# Altium footprint library PCB_CONNECTORS.PcbLib: 676 footprints (part 1 of 43) (continued)
## AMPHENOL_L77SDEH09SOL2RM5 - duplicate [mm] "Straight D-SUB 9 Female Contacts for PCB with Rear Insert (UNC4-40) and RM5 Standoff Boardlock" (continued)
  text "1" at 8.85,1 h1.2
  text "5" at -9.525,1 h1.2
  text "6" at 8.525,-2.05 h1.2
  text "9" at -9.5,-2.025 h1.2
3D body "AMPHENOL_L77SDEH09SOL2RM5.stp": height 13, standoff -4.2, extent -15.445,-6.21 15.445,6.21

## AMPHENOL_L717DFA15P1ATN [mm] "Right Angled D-Sub 15 Male Contacts with Metal Bracket and Front Female Screwlock (UNC4-40)"
height 13.4
pads (17):
  round 1.6 hole 0.9: 1(9.59,-1.27) 2(6.85,-1.27) 3(4.11,-1.27) 4(1.37,-1.27) 5(-1.37,-1.27) 6(-4.11,-1.27) 7(-6.85,-1.27) 8(-9.59,-1.27) 9(8.22,1.27) 10(5.48,1.27) 11(2.74,1.27) 12(0,1.27) 13(-2.74,1.27) 14(-5.48,1.27) 15(-8.22,1.27)
  round 5.5 hole 3.2: 16(-16.65,0) 17(16.65,0)
Top Overlay:
  circle w0.2: c-16.65,5.2 r0.8
  circle w0.2: c16.65,5.2 r0.8
  lines w0.2: -19.5,10.67 -19.5,11.57 19.5,11.57 19.5,10.67 ; -19.15,9.67 -19.15,9.17 -14.15,9.17 -14.15,9.67 ; -19.15,11.57 -19.15,16.77 -14.15,16.77 -14.15,11.57 ; -18.15,-2.93 -19.75,-2.93 -19.75,10.67 19.75,10.67 19.75,-2.93 18.15,-2.93 ; -15.15,-2.93 -13.55,-2.93 -13.55,10.67 ; -13.689,9.67 -19.75,9.67 -13.55,9.67 ; -13.55,7.17 13.55,7.17 ; -12.901,11.57 -12.901,17.17 cw(c-12.601,17.17) -12.601,17.47 12.602,17.47 cw(c12.602,17.17) 12.902,17.17 12.902,11.57 ; -11.72,7.17 -11.72,6.17 11.72,6.17 11.72,7.17 ; 13.55,9.67 19.75,9.67 ; 13.55,10.67 13.55,-2.93 15.15,-2.93 ; 14.15,9.67 14.15,9.17 19.15,9.17 19.15,9.67 ; 14.15,11.57 14.15,16.77 19.15,16.77 19.15,11.57
  text "15" at -11.938,0.508 h1.5
  text "8" at -11.811,-2.032 h1.5
  text "1" at 11.176,-2.032 h1.5
  text "9" at 10.841,0.508 h1.5
Mechanical 8:
  lines w0.1: -17.65,0 -16.65,0 ; -16.65,-1 -16.65,0 ; -16.65,1 -16.65,0 ; -15.65,0 -16.65,0 ; -10.59,-1.27 -9.59,-1.27 ; -9.59,-2.27 -9.59,-1.27 ; -9.59,-0.27 -9.59,-1.27 ; -9.22,1.27 -8.22,1.27 ; -8.59,-1.27 -9.59,-1.27 ; -8.22,0.27 -8.22,1.27 ; -8.22,2.27 -8.22,1.27 ; -7.85,-1.27 -6.85,-1.27 ; -7.22,1.27 -8.22,1.27 ; -6.85,-2.27 -6.85,-1.27 ; -6.85,-0.27 -6.85,-1.27 ; -6.48,1.27 -5.48,1.27 ; -5.85,-1.27 -6.85,-1.27 ; -5.48,0.27 -5.48,1.27 ; -5.48,2.27 -5.48,1.27 ; -5.11,-1.27 -4.11,-1.27 ; -4.48,1.27 -5.48,1.27 ; -4.11,-2.27 -4.11,-1.27 ; -4.11,-0.27 -4.11,-1.27 ; -3.74,1.27 -2.74,1.27 ; -3.11,-1.27 -4.11,-1.27 ; -2.74,0.27 -2.74,1.27 ; -2.74,2.27 -2.74,1.27 ; -2.37,-1.27 -1.37,-1.27 ; -1.74,1.27 -2.74,1.27 ; -1.37,-2.27 -1.37,-1.27 ; -1.37,-0.27 -1.37,-1.27 ; -1,0 0,0 ; -1,1.27 0,1.27 ; -0.37,-1.27 -1.37,-1.27 ; 0,-1 0,0 ; 0,0.27 0,1.27 ; 0,1 0,0 ; 0,2.27 0,1.27 ; 0.37,-1.27 1.37,-1.27 ; 1,0 0,0 ; 1,1.27 0,1.27 ; 1.37,-2.27 1.37,-1.27 ; 1.37,-0.27 1.37,-1.27 ; 1.74,1.27 2.74,1.27 ; 2.37,-1.27 1.37,-1.27 ; 2.74,0.27 2.74,1.27 ; 2.74,2.27 2.74,1.27 ; 3.11,-1.27 4.11,-1.27 ; 3.74,1.27 2.74,1.27 ; 4.11,-2.27 4.11,-1.27 ; 4.11,-0.27 4.11,-1.27 ; 4.48,1.27 5.48,1.27 ; 5.11,-1.27 4.11,-1.27 ; 5.48,0.27 5.48,1.27 ; 5.48,2.27 5.48,1.27 ; 5.85,-1.27 6.85,-1.27 ; 6.48,1.27 5.48,1.27 ; 6.85,-2.27 6.85,-1.27 ; 6.85,-0.27 6.85,-1.27 ; 7.22,1.27 8.22,1.27 ; 7.85,-1.27 6.85,-1.27 ; 8.22,0.27 8.22,1.27 ; 8.22,2.27 8.22,1.27 ; 8.59,-1.27 9.59,-1.27 ; 9.22,1.27 8.22,1.27 ; 9.59,-2.27 9.59,-1.27 ; 9.59,-0.27 9.59,-1.27 ; 10.59,-1.27 9.59,-1.27 ; 15.65,0 16.65,0 ; 16.65,-1 16.65,0 ; 16.65,1 16.65,0 ; 17.65,0 16.65,0
Mechanical 14:
  circle w0.1: c-16.65,0 r1.6
  circle w0.1: c-16.65,5.2 r0.8
  circle w0.1: c16.65,5.2 r0.8
  circle w0.1: c16.65,0 r1.6
  lines w0.1: -19.5,10.67 -19.5,11.57 19.5,11.57 19.5,10.67 ; -19.15,9.67 -19.15,9.17 -14.15,9.17 -14.15,9.67 ; -19.15,11.57 -19.15,16.77 -14.15,16.77 -14.15,11.57 ; -13.689,9.67 -19.75,9.67 -13.55,9.67 ; -13.55,7.17 13.55,7.17 ; -13.55,10.67 -13.55,-2.93 -19.75,-2.93 -19.75,10.67 19.75,10.67 19.75,-2.93 13.55,-2.93 13.55,10.67 ; -12.901,11.57 -12.901,17.17 cw(c-12.601,17.17) -12.601,17.47 12.602,17.47 cw(c12.602,17.17) 12.902,17.17 12.902,11.57 ; -11.72,7.17 -11.72,6.17 11.72,6.17 11.72,7.17 ; -9.99,6.17 -9.99,-1.27 ccw(c-9.59,-1.27) -9.19,-1.27 -9.19,6.17 ; -8.62,6.17 -8.62,1.27 ccw(c-8.22,1.27) -7.82,1.27 -7.82,6.17 ; -7.25,6.17 -7.25,-1.27 ccw(c-6.85,-1.27) -6.45,-1.27 -6.45,6.17 ; -5.88,6.17 -5.88,1.27 ccw(c-5.48,1.27) -5.08,1.27 -5.08,6.17 ; -4.51,6.17 -4.51,-1.27 ccw(c-4.11,-1.27) -3.71,-1.27 -3.71,6.17 ; -3.14,6.17 -3.14,1.27 ccw(c-2.74,1.27) -2.34,1.27 -2.34,6.17 ; -1.77,6.17 -1.77,-1.27 ccw(c-1.37,-1.27) -0.97,-1.27 -0.97,6.17 ; -0.4,6.17 -0.4,1.27 ccw(c0,1.27) 0.4,1.27 0.4,6.17 ; 0.97,6.17 0.97,-1.27 ccw(c1.37,-1.27) 1.77,-1.27 1.77,6.17 ; 2.34,6.17 2.34,1.27 ccw(c2.74,1.27) 3.14,1.27 3.14,6.17 ; 3.71,6.17 3.71,-1.27 ccw(c4.11,-1.27) 4.51,-1.27 4.51,6.17 ; 5.08,6.17 5.08,1.27 ccw(c5.48,1.27) 5.88,1.27 5.88,6.17 ; 6.45,6.17 6.45,-1.27 ccw(c6.85,-1.27) 7.25,-1.27 7.25,6.17 ; 7.82,6.17 7.82,1.27 ccw(c8.22,1.27) 8.62,1.27 8.62,6.17 ; 9.19,6.17 9.19,-1.27 ccw(c9.59,-1.27) 9.99,-1.27 9.99,6.17 ; 13.55,9.67 19.75,9.67 ; 14.15,9.67 14.15,9.17 19.15,9.17 19.15,9.67 ; 14.15,11.57 14.15,16.77 19.15,16.77 19.15,11.57
3D body "AMPHENOL_L717DFA15P1ATN.stp": height 13.45, standoff -3.95, extent -19.75,-2.93 19.75,17.47

## AMPHENOL_L717DFA15S1ATN [mm] "Right Angled D-Sub 15 Female Contacts with Metal Bracket and Front Female Screwlock (UNC4-40)"
height 13.4
pads (17):
  round 1.6 hole 0.9: 1(-9.59,-1.27) 2(-6.85,-1.27) 3(-4.11,-1.27) 4(-1.37,-1.27) 5(1.37,-1.27) 6(4.11,-1.27) 7(6.85,-1.27) 8(9.59,-1.27) 9(-8.22,1.27) 10(-5.48,1.27) 11(-2.74,1.27) 12(0,1.27) 13(2.74,1.27) 14(5.48,1.27) 15(8.22,1.27)
  round 5.5 hole 3.2: 16(-16.65,0) 17(16.65,0)
Top Overlay:
  circle w0.2: c-16.65,5.2 r0.8
  circle w0.2: c16.65,5.2 r0.8
  lines w0.2: -19.5,10.67 -19.5,11.57 19.5,11.57 19.5,10.67 ; -19.15,9.67 -19.15,9.17 -14.15,9.17 -14.15,9.67 ; -19.15,11.57 -19.15,16.77 -14.15,16.77 -14.15,11.57 ; -18.15,-2.93 -19.75,-2.93 -19.75,10.67 19.75,10.67 19.75,-2.93 18.15,-2.93 ; -15.15,-2.93 -13.55,-2.93 -13.55,10.67 ; -13.689,9.67 -19.75,9.67 -13.55,9.67 ; -13.55,7.17 13.55,7.17 ; -12.292,11.57 -12.292,17.37 cw(c-11.992,17.37) -11.992,17.67 12.011,17.67 cw(c12.011,17.37) 12.311,17.37 12.311,11.57 ; -11.72,7.17 -11.72,6.17 11.72,6.17 11.72,7.17 ; 13.55,9.67 19.75,9.67 ; 13.55,10.67 13.55,-2.93 15.15,-2.93 ; 14.15,9.67 14.15,9.17 19.15,9.17 19.15,9.67 ; 14.15,11.57 14.15,16.77 19.15,16.77 19.15,11.57
  text "9" at -11.476,0.508 h1.5
  text "1" at -11.349,-2.032 h1.5
  text "8" at 10.841,-2.032 h1.5
  text "15" at 10.841,0.508 h1.5
Mechanical 8:
  lines w0.1: -17.65,0 -16.65,0 ; -16.65,-1 -16.65,0 ; -16.65,1 -16.65,0 ; -15.65,0 -16.65,0 ; -10.59,-1.27 -9.59,-1.27 ; -9.59,-2.27 -9.59,-1.27 ; -9.59,-0.27 -9.59,-1.27 ; -9.22,1.27 -8.22,1.27 ; -8.59,-1.27 -9.59,-1.27 ; -8.22,0.27 -8.22,1.27 ; -8.22,2.27 -8.22,1.27 ; -7.85,-1.27 -6.85,-1.27 ; -7.22,1.27 -8.22,1.27 ; -6.85,-2.27 -6.85,-1.27 ; -6.85,-0.27 -6.85,-1.27 ; -6.48,1.27 -5.48,1.27 ; -5.85,-1.27 -6.85,-1.27 ; -5.48,0.27 -5.48,1.27 ; -5.48,2.27 -5.48,1.27 ; -5.11,-1.27 -4.11,-1.27 ; -4.48,1.27 -5.48,1.27 ; -4.11,-2.27 -4.11,-1.27 ; -4.11,-0.27 -4.11,-1.27 ; -3.74,1.27 -2.74,1.27 ; -3.11,-1.27 -4.11,-1.27 ; -2.74,0.27 -2.74,1.27 ; -2.74,2.27 -2.74,1.27 ; -2.37,-1.27 -1.37,-1.27 ; -1.74,1.27 -2.74,1.27 ; -1.37,-2.27 -1.37,-1.27 ; -1.37,-0.27 -1.37,-1.27 ; -1,0 0,0 ; -1,1.27 0,1.27 ; -0.37,-1.27 -1.37,-1.27 ; 0,-1 0,0 ; 0,0.27 0,1.27 ; 0,1 0,0 ; 0,2.27 0,1.27 ; 0.37,-1.27 1.37,-1.27 ; 1,0 0,0 ; 1,1.27 0,1.27 ; 1.37,-2.27 1.37,-1.27 ; 1.37,-0.27 1.37,-1.27 ; 1.74,1.27 2.74,1.27 ; 2.37,-1.27 1.37,-1.27 ; 2.74,0.27 2.74,1.27 ; 2.74,2.27 2.74,1.27 ; 3.11,-1.27 4.11,-1.27 ; 3.74,1.27 2.74,1.27 ; 4.11,-2.27 4.11,-1.27 ; 4.11,-0.27 4.11,-1.27 ; 4.48,1.27 5.48,1.27 ; 5.11,-1.27 4.11,-1.27 ; 5.48,0.27 5.48,1.27 ; 5.48,2.27 5.48,1.27 ; 5.85,-1.27 6.85,-1.27 ; 6.48,1.27 5.48,1.27 ; 6.85,-2.27 6.85,-1.27 ; 6.85,-0.27 6.85,-1.27 ; 7.22,1.27 8.22,1.27 ; 7.85,-1.27 6.85,-1.27 ; 8.22,0.27 8.22,1.27 ; 8.22,2.27 8.22,1.27 ; 8.59,-1.27 9.59,-1.27 ; 9.22,1.27 8.22,1.27 ; 9.59,-2.27 9.59,-1.27 ; 9.59,-0.27 9.59,-1.27 ; 10.59,-1.27 9.59,-1.27 ; 15.65,0 16.65,0 ; 16.65,-1 16.65,0 ; 16.65,1 16.65,0 ; 17.65,0 16.65,0
Mechanical 14:
  circle w0.1: c-16.65,0 r1.6
  circle w0.1: c-16.65,5.2 r0.8
  circle w0.1: c16.65,5.2 r0.8
  circle w0.1: c16.65,0 r1.6
  lines w0.1: -19.5,10.67 -19.5,11.57 19.5,11.57 19.5,10.67 ; -19.15,9.67 -19.15,9.17 -14.15,9.17 -14.15,9.67 ; -19.15,11.57 -19.15,16.77 -14.15,16.77 -14.15,11.57 ; -13.689,9.67 -19.75,9.67 -13.55,9.67 ; -13.55,7.17 13.55,7.17 ; -13.55,10.67 -13.55,-2.93 -19.75,-2.93 -19.75,10.67 19.75,10.67 19.75,-2.93 13.55,-2.93 13.55,10.67 ; -12.292,11.57 -12.292,17.37 cw(c-11.992,17.37) -11.992,17.67 12.011,17.67 cw(c12.011,17.37) 12.311,17.37 12.311,11.57 ; -11.72,7.17 -11.72,6.17 11.72,6.17 11.72,7.17 ; -9.99,6.17 -9.99,-1.27 ccw(c-9.59,-1.27) -9.19,-1.27 -9.19,6.17 ; -8.62,6.17 -8.62,1.27 ccw(c-8.22,1.27) -7.82,1.27 -7.82,6.17 ; -7.25,6.17 -7.25,-1.27 ccw(c-6.85,-1.27) -6.45,-1.27 -6.45,6.17 ; -5.88,6.17 -5.88,1.27 ccw(c-5.48,1.27) -5.08,1.27 -5.08,6.17 ; -4.51,6.17 -4.51,-1.27 ccw(c-4.11,-1.27) -3.71,-1.27 -3.71,6.17 ; -3.14,6.17 -3.14,1.27 ccw(c-2.74,1.27) -2.34,1.27 -2.34,6.17 ; -1.77,6.17 -1.77,-1.27 ccw(c-1.37,-1.27) -0.97,-1.27 -0.97,6.17 ; -0.4,6.17 -0.4,1.27 ccw(c0,1.27) 0.4,1.27 0.4,6.17 ; 0.97,6.17 0.97,-1.27 ccw(c1.37,-1.27) 1.77,-1.27 1.77,6.17 ; 2.34,6.17 2.34,1.27 ccw(c2.74,1.27) 3.14,1.27 3.14,6.17 ; 3.71,6.17 3.71,-1.27 ccw(c4.11,-1.27) 4.51,-1.27 4.51,6.17 ; 5.08,6.17 5.08,1.27 ccw(c5.48,1.27) 5.88,1.27 5.88,6.17 ; 6.45,6.17 6.45,-1.27 ccw(c6.85,-1.27) 7.25,-1.27 7.25,6.17 ; 7.82,6.17 7.82,1.27 ccw(c8.22,1.27) 8.62,1.27 8.62,6.17 ; 9.19,6.17 9.19,-1.27 ccw(c9.59,-1.27) 9.99,-1.27 9.99,6.17 ; 13.55,9.67 19.75,9.67 ; 14.15,9.67 14.15,9.17 19.15,9.17 19.15,9.67 ; 14.15,11.57 14.15,16.77 19.15,16.77 19.15,11.57
3D body "AMPHENOL_L717DFA15S1ATN.stp": height 13.45, standoff -3.95, extent -19.75,-2.93 19.75,17.67

## AMPHENOL_L717DFB25P1ATN [mm] "Right Angled D-Sub 25 Male Contacts with Metal Bracket and Front Female Screwlock (UNC4-40)"
height 13.4
pads (27):
  round 1.6 hole 0.9: 1(16.62,-1.27) 2(13.85,-1.27) 3(11.08,-1.27) 4(8.31,-1.27) 5(5.54,-1.27) 6(2.77,-1.27) 7(0,-1.27) 8(-2.77,-1.27) 9(-5.54,-1.27) 10(-8.31,-1.27) 11(-11.08,-1.27) 12(-13.85,-1.27) 13(-16.62,-1.27) 14(15.25,1.27) 15(12.48,1.27) 16(9.71,1.27) 17(6.94,1.27) 18(4.17,1.27) 19(1.4,1.27) 20(-1.37,1.27) 21(-4.14,1.27) 22(-6.91,1.27) 23(-9.68,1.27) 24(-12.45,1.27) 25(-15.22,1.27)
  round 5.5 hole 3.2: 26(-23.5,0) 27(23.5,0)
Top Overlay:
  circle w0.2: c-23.5,5.2 r0.8
  circle w0.2: c23.5,5.2 r0.8
  lines w0.2: -26.35,10.67 -26.35,11.57 26.35,11.57 26.35,10.67 ; -26,9.67 -26,9.17 -21,9.17 -21,9.67 ; -26,11.57 -26,16.77 -21,16.77 -21,11.57 ; -25,-2.93 -26.6,-2.93 -26.6,10.67 26.6,10.67 26.6,-2.93 25,-2.93 ; -22,-2.93 -20.4,-2.93 -20.4,10.67 ; -20.539,9.67 -26.6,9.67 -20.4,9.67 ; -20.4,7.17 20.4,7.17 ; -19.751,11.57 -19.751,17.17 cw(c-19.451,17.17) -19.451,17.47 19.452,17.47 cw(c19.452,17.17) 19.752,17.17 19.752,11.57 ; -18.57,7.17 -18.57,6.17 18.57,6.17 18.57,7.17 ; 20.4,9.67 26.6,9.67 ; 20.4,10.67 20.4,-2.93 22,-2.93 ; 21,9.67 21,9.17 26,9.17 26,9.67 ; 21,11.57 21,16.77 26,16.77 26,11.57
  text "1" at 17.871,-2.032 h1.2
  text "14" at 17.871,0.508 h1.2
  text "13" at -19.9,-2 h1.2
  text "25" at -18.887,0.508 h1.2
Mechanical 8:
  lines w0.1: -24.5,0 -23.5,0 ; -23.5,-1 -23.5,0 ; -23.5,1 -23.5,0 ; -22.5,0 -23.5,0 ; -17.62,-1.27 -16.62,-1.27 ; -16.62,-2.27 -16.62,-1.27 ; -16.62,-0.27 -16.62,-1.27 ; -16.22,1.27 -15.22,1.27 ; -15.62,-1.27 -16.62,-1.27 ; -15.22,0.27 -15.22,1.27 ; -15.22,2.27 -15.22,1.27 ; -14.85,-1.27 -13.85,-1.27 ; -14.22,1.27 -15.22,1.27 ; -13.85,-2.27 -13.85,-1.27 ; -13.85,-0.27 -13.85,-1.27 ; -13.45,1.27 -12.45,1.27 ; -12.85,-1.27 -13.85,-1.27 ; -12.45,0.27 -12.45,1.27 ; -12.45,2.27 -12.45,1.27 ; -12.08,-1.27 -11.08,-1.27 ; -11.45,1.27 -12.45,1.27 ; -11.08,-2.27 -11.08,-1.27 ; -11.08,-0.27 -11.08,-1.27 ; -10.68,1.27 -9.68,1.27 ; -10.08,-1.27 -11.08,-1.27 ; -9.68,0.27 -9.68,1.27 ; -9.68,2.27 -9.68,1.27 ; -9.31,-1.27 -8.31,-1.27 ; -8.68,1.27 -9.68,1.27 ; -8.31,-2.27 -8.31,-1.27 ; -8.31,-0.27 -8.31,-1.27 ; -7.91,1.27 -6.91,1.27 ; -7.31,-1.27 -8.31,-1.27 ; -6.91,0.27 -6.91,1.27 ; -6.91,2.27 -6.91,1.27 ; -6.54,-1.27 -5.54,-1.27 ; -5.91,1.27 -6.91,1.27 ; -5.54,-2.27 -5.54,-1.27 ; -5.54,-0.27 -5.54,-1.27 ; -5.14,1.27 -4.14,1.27 ; -4.54,-1.27 -5.54,-1.27 ; -4.14,0.27 -4.14,1.27 ; -4.14,2.27 -4.14,1.27 ; -3.77,-1.27 -2.77,-1.27 ; -3.14,1.27 -4.14,1.27 ; -2.77,-2.27 -2.77,-1.27 ; -2.77,-0.27 -2.77,-1.27 ; -2.37,1.27 -1.37,1.27 ; -1.77,-1.27 -2.77,-1.27 ; -1.37,0.27 -1.37,1.27 ; -1.37,2.27 -1.37,1.27 ; -1,-1.27 0,-1.27 ; -0.37,1.27 -1.37,1.27 ; 0,-2.27 0,-1.27 ; 0,-0.27 0,-1.27 ; 0.4,1.27 1.4,1.27 ; 1,-1.27 0,-1.27 ; 1.4,0.27 1.4,1.27 ; 1.4,2.27 1.4,1.27 ; 1.77,-1.27 2.77,-1.27 ; 2.4,1.27 1.4,1.27 ; 2.77,-2.27 2.77,-1.27 ; 2.77,-0.27 2.77,-1.27 ; 3.17,1.27 4.17,1.27 ; 3.77,-1.27 2.77,-1.27 ; 4.17,0.27 4.17,1.27 ; 4.17,2.27 4.17,1.27 ; 4.54,-1.27 5.54,-1.27 ; 5.17,1.27 4.17,1.27 ; 5.54,-2.27 5.54,-1.27 ; 5.54,-0.27 5.54,-1.27 ; 5.94,1.27 6.94,1.27 ; 6.54,-1.27 5.54,-1.27 ; 6.94,0.27 6.94,1.27 ; 6.94,2.27 6.94,1.27 ; 7.31,-1.27 8.31,-1.27 ; 7.94,1.27 6.94,1.27 ; 8.31,-2.27 8.31,-1.27 ; 8.31,-0.27 8.31,-1.27 ; 8.71,1.27 9.71,1.27 ; 9.31,-1.27 8.31,-1.27 ; 9.71,0.27 9.71,1.27 ; 9.71,2.27 9.71,1.27 ; 10.08,-1.27 11.08,-1.27 ; 10.71,1.27 9.71,1.27 ; 11.08,-2.27 11.08,-1.27 ; 11.08,-0.27 11.08,-1.27 ; 11.48,1.27 12.48,1.27 ; 12.08,-1.27 11.08,-1.27 ; 12.48,0.27 12.48,1.27 ; 12.48,2.27 12.48,1.27 ; 12.85,-1.27 13.85,-1.27 ; 13.48,1.27 12.48,1.27 ; 13.85,-2.27 13.85,-1.27 ; 13.85,-0.27 13.85,-1.27 ; 14.25,1.27 15.25,1.27 ; 14.85,-1.27 13.85,-1.27 ; 15.25,0.27 15.25,1.27 ; 15.25,2.27 15.25,1.27 ; 15.62,-1.27 16.62,-1.27 ; 16.25,1.27 15.25,1.27 ; 16.62,-2.27 16.62,-1.27 ; 16.62,-0.27 16.62,-1.27 ; 17.62,-1.27 16.62,-1.27 ; 22.5,0 23.5,0 ; 23.5,-1 23.5,0 ; 23.5,1 23.5,0 ; 24.5,0 23.5,0 ; 0,0 0,-1 0,0 ; 0,0 0,1 0,0 ; 0,0 1,0 0,0 ; 0,0 -1,0 0,0
Mechanical 14:
  circle w0.1: c-23.5,0 r1.6
  circle w0.1: c-23.5,5.2 r0.8
  circle w0.1: c23.5,5.2 r0.8
  circle w0.1: c23.5,0 r1.6
  lines w0.1: -26.35,10.67 -26.35,11.57 26.35,11.57 26.35,10.67 ; -26,9.67 -26,9.17 -21,9.17 -21,9.67 ; -26,11.57 -26,16.77 -21,16.77 -21,11.57 ; -20.539,9.67 -26.6,9.67 -20.4,9.67 ; -20.4,7.17 20.4,7.17 ; -20.4,10.67 -20.4,-2.93 -26.6,-2.93 -26.6,10.67 26.6,10.67 26.6,-2.93 20.4,-2.93 20.4,10.67 ; -19.751,11.57 -19.751,17.17 cw(c-19.451,17.17) -19.451,17.47 19.452,17.47 cw(c19.452,17.17) 19.752,17.17 19.752,11.57 ; -18.57,7.17 -18.57,6.17 18.57,6.17 18.57,7.17 ; -17.02,6.17 -17.02,-1.27 ccw(c-16.62,-1.27) -16.22,-1.27 -16.22,6.17 ; -15.62,6.17 -15.62,1.27 ccw(c-15.22,1.27) -14.82,1.27 -14.82,6.17 ; -14.25,6.17 -14.25,-1.27 ccw(c-13.85,-1.27) -13.45,-1.27 -13.45,6.17 ; -12.85,6.17 -12.85,1.27 ccw(c-12.45,1.27) -12.05,1.27 -12.05,6.17 ; -11.48,6.17 -11.48,-1.27 ccw(c-11.08,-1.27) -10.68,-1.27 -10.68,6.17 ; -10.08,6.17 -10.08,1.27 ccw(c-9.68,1.27) -9.28,1.27 -9.28,6.17 ; -8.71,6.17 -8.71,-1.27 ccw(c-8.31,-1.27) -7.91,-1.27 -7.91,6.17 ; -7.31,6.17 -7.31,1.27 ccw(c-6.91,1.27) -6.51,1.27 -6.51,6.17 ; -5.94,6.17 -5.94,-1.27 ccw(c-5.54,-1.27) -5.14,-1.27 -5.14,6.17 ; -4.54,6.17 -4.54,1.27 ccw(c-4.14,1.27) -3.74,1.27 -3.74,6.17 ; -3.17,6.17 -3.17,-1.27 ccw(c-2.77,-1.27) -2.37,-1.27 -2.37,6.17 ; -1.77,6.17 -1.77,1.27 ccw(c-1.37,1.27) -0.97,1.27 -0.97,6.17 ; -0.4,6.17 -0.4,-1.27 ccw(c0,-1.27) 0.4,-1.27 0.4,6.17 ; 1,6.17 1,1.27 ccw(c1.4,1.27) 1.8,1.27 1.8,6.17 ; 2.37,6.17 2.37,-1.27 ccw(c2.77,-1.27) 3.17,-1.27 3.17,6.17 ; 3.77,6.17 3.77,1.27 ccw(c4.17,1.27) 4.57,1.27 4.57,6.17 ; 5.14,6.17 5.14,-1.27 ccw(c5.54,-1.27) 5.94,-1.27 5.94,6.17 ; 6.54,6.17 6.54,1.27 ccw(c6.94,1.27) 7.34,1.27 7.34,6.17 ; 7.91,6.17 7.91,-1.27 ccw(c8.31,-1.27) 8.71,-1.27 8.71,6.17 ; 9.31,6.17 9.31,1.27 ccw(c9.71,1.27) 10.11,1.27 10.11,6.17 ; 10.68,6.17 10.68,-1.27 ccw(c11.08,-1.27) 11.48,-1.27 11.48,6.17 ; 12.08,6.17 12.08,1.27 ccw(c12.48,1.27) 12.88,1.27 12.88,6.17 ; 13.45,6.17 13.45,-1.27 ccw(c13.85,-1.27) 14.25,-1.27 14.25,6.17 ; 14.85,6.17 14.85,1.27 ccw(c15.25,1.27) 15.65,1.27 15.65,6.17 ; 16.22,6.17 16.22,-1.27 ccw(c16.62,-1.27) 17.02,-1.27 17.02,6.17 ; 20.4,9.67 26.6,9.67 ; 21,9.67 21,9.17 26,9.17 26,9.67 ; 21,11.57 21,16.77 26,16.77 26,11.57
3D body "AMPHENOL_L717DFA25P1ATN.stp": height 13.45, standoff -3.95, extent -26.6,-2.93 26.6,17.47

## AMPHENOL_L717DFC37P1ATN [mm] "Right Angled D-Sub 37 Male Contacts with Metal Bracket and Front Female Screwlock (UNC4-40)"
height 13.4
pads (39):
  round 1.6 hole 0.9: 1(24.93,-1.27) 2(22.16,-1.27) 3(19.39,-1.27) 4(16.62,-1.27) 5(13.85,-1.27) 6(11.08,-1.27) 7(8.31,-1.27) 8(5.54,-1.27) 9(2.77,-1.27) 10(0,-1.27) 11(-2.77,-1.27) 12(-5.54,-1.27) 13(-8.31,-1.27) 14(-11.08,-1.27) 15(-13.85,-1.27) 16(-16.62,-1.27) 17(-19.39,-1.27) 18(-22.16,-1.27) 19(-24.93,-1.27) 20(23.56,1.27) 21(20.79,1.27) 22(18.02,1.27) 23(15.25,1.27) 24(12.48,1.27) 25(9.71,1.27) 26(6.94,1.27) 27(4.17,1.27) 28(1.4,1.27) 29(-1.37,1.27) 30(-4.14,1.27) 31(-6.91,1.27) 32(-9.68,1.27) 33(-12.45,1.27) 34(-15.22,1.27) 35(-17.99,1.27) 36(-20.76,1.27) 37(-23.53,1.27)
  round 5.5 hole 3.2: 38(31.75,0) 39(-31.75,0)
Top Overlay:
  circle w0.2: c31.75,5.2 r0.8
  circle w0.2: c-31.75,5.2 r0.8
  lines w0.2: -34.6,10.67 -34.6,11.57 34.6,11.57 34.6,10.67 ; -34.25,9.67 -34.25,9.17 -29.25,9.17 -29.25,9.67 ; -34.25,11.57 -34.25,16.77 -29.25,16.77 -29.25,11.57 ; -32.907,-2.93 -34.85,-2.93 -34.85,10.67 34.85,10.67 34.85,-2.93 32.907,-2.93 ; -30.593,-2.93 -28.65,-2.93 -28.65,10.67 ; -28.789,9.67 -34.85,9.67 -28.65,9.67 ; -28.65,7.17 28.65,7.17 ; -28.001,11.57 -28.001,17.17 cw(c-27.701,17.17) -27.701,17.47 27.702,17.47 cw(c27.702,17.17) 28.002,17.17 28.002,11.57 ; -26.82,7.17 -26.82,6.17 26.82,6.17 26.82,7.17 ; 28.65,9.67 34.85,9.67 ; 28.65,10.67 28.65,-2.93 30.593,-2.93 ; 29.25,9.67 29.25,9.17 34.25,9.17 34.25,9.67 ; 29.25,11.57 29.25,16.77 34.25,16.77 34.25,11.57
  text "37" at -27.197,0.508 h1.2
  text "19" at -28.21,-2 h1.2
  text "1" at 26.181,-2.032 h1.2
  text "20" at 26.181,0.508 h1.2
Mechanical 8:
  drawing of 164 lines, arcs and shapes, not listed
Mechanical 14:
  circle w0.1: c31.75,0 r1.6
  circle w0.1: c31.75,5.2 r0.8
  circle w0.1: c-31.75,5.2 r0.8
  circle w0.1: c-31.75,0 r1.6
  lines w0.1: -34.6,10.67 -34.6,11.57 34.6,11.57 34.6,10.67 ; -34.25,9.67 -34.25,9.17 -29.25,9.17 -29.25,9.67 ; -34.25,11.57 -34.25,16.77 -29.25,16.77 -29.25,11.57 ; -28.789,9.67 -34.85,9.67 -28.65,9.67 ; -28.65,7.17 28.65,7.17 ; -28.65,10.67 -28.65,-2.93 -34.85,-2.93 -34.85,10.67 34.85,10.67 34.85,-2.93 28.65,-2.93 28.65,10.67 ; -28.001,11.57 -28.001,17.17 cw(c-27.701,17.17) -27.701,17.47 27.702,17.47 cw(c27.702,17.17) 28.002,17.17 28.002,11.57 ; -26.82,7.17 -26.82,6.17 26.82,6.17 26.82,7.17 ; -25.33,6.17 -25.33,-1.27 ccw(c-24.93,-1.27) -24.53,-1.27 -24.53,6.17 ; -23.93,6.17 -23.93,1.27 ccw(c-23.53,1.27) -23.13,1.27 -23.13,6.17 ; -22.56,6.17 -22.56,-1.27 ccw(c-22.16,-1.27) -21.76,-1.27 -21.76,6.17 ; -21.16,6.17 -21.16,1.27 ccw(c-20.76,1.27) -20.36,1.27 -20.36,6.17 ; -19.79,6.17 -19.79,-1.27 ccw(c-19.39,-1.27) -18.99,-1.27 -18.99,6.17 ; -18.39,6.17 -18.39,1.27 ccw(c-17.99,1.27) -17.59,1.27 -17.59,6.17 ; -17.02,6.17 -17.02,-1.27 ccw(c-16.62,-1.27) -16.22,-1.27 -16.22,6.17 ; -15.62,6.17 -15.62,1.27 ccw(c-15.22,1.27) -14.82,1.27 -14.82,6.17 ; -14.25,6.17 -14.25,-1.27 ccw(c-13.85,-1.27) -13.45,-1.27 -13.45,6.17 ; -12.85,6.17 -12.85,1.27 ccw(c-12.45,1.27) -12.05,1.27 -12.05,6.17 ; -11.48,6.17 -11.48,-1.27 ccw(c-11.08,-1.27) -10.68,-1.27 -10.68,6.17 ; -10.08,6.17 -10.08,1.27 ccw(c-9.68,1.27) -9.28,1.27 -9.28,6.17 ; -8.71,6.17 -8.71,-1.27 ccw(c-8.31,-1.27) -7.91,-1.27 -7.91,6.17 ; -7.31,6.17 -7.31,1.27 ccw(c-6.91,1.27) -6.51,1.27 -6.51,6.17 ; -5.94,6.17 -5.94,-1.27 ccw(c-5.54,-1.27) -5.14,-1.27 -5.14,6.17 ; -4.54,6.17 -4.54,1.27 ccw(c-4.14,1.27) -3.74,1.27 -3.74,6.17 ; -3.17,6.17 -3.17,-1.27 ccw(c-2.77,-1.27) -2.37,-1.27 -2.37,6.17 ; -1.77,6.17 -1.77,1.27 ccw(c-1.37,1.27) -0.97,1.27 -0.97,6.17 ; -0.4,6.17 -0.4,-1.27 ccw(c0,-1.27) 0.4,-1.27 0.4,6.17 ; 1,6.17 1,1.27 ccw(c1.4,1.27) 1.8,1.27 1.8,6.17 ; 2.37,6.17 2.37,-1.27 ccw(c2.77,-1.27) 3.17,-1.27 3.17,6.17 ; 3.77,6.17 3.77,1.27 ccw(c4.17,1.27) 4.57,1.27 4.57,6.17 ; 5.14,6.17 5.14,-1.27 ccw(c5.54,-1.27) 5.94,-1.27 5.94,6.17 ; 6.54,6.17 6.54,1.27 ccw(c6.94,1.27) 7.34,1.27 7.34,6.17 ; 7.91,6.17 7.91,-1.27 ccw(c8.31,-1.27) 8.71,-1.27 8.71,6.17 ; 9.31,6.17 9.31,1.27 ccw(c9.71,1.27) 10.11,1.27 10.11,6.17 ; 10.68,6.17 10.68,-1.27 ccw(c11.08,-1.27) 11.48,-1.27 11.48,6.17 ; 12.08,6.17 12.08,1.27 ccw(c12.48,1.27) 12.88,1.27 12.88,6.17 ; 13.45,6.17 13.45,-1.27 ccw(c13.85,-1.27) 14.25,-1.27 14.25,6.17 ; 14.85,6.17 14.85,1.27 ccw(c15.25,1.27) 15.65,1.27 15.65,6.17 ; 16.22,6.17 16.22,-1.27 ccw(c16.62,-1.27) 17.02,-1.27 17.02,6.17 ; 17.62,6.17 17.62,1.27 ccw(c18.02,1.27) 18.42,1.27 18.42,6.17 ; 18.99,6.17 18.99,-1.27 ccw(c19.39,-1.27) 19.79,-1.27 19.79,6.17 ; 20.39,6.17 20.39,1.27 ccw(c20.79,1.27) 21.19,1.27 21.19,6.17 ; 21.76,6.17 21.76,-1.27 ccw(c22.16,-1.27) 22.56,-1.27 22.56,6.17 ; 23.16,6.17 23.16,1.27 ccw(c23.56,1.27) 23.96,1.27 23.96,6.17 ; 24.53,6.17 24.53,-1.27 ccw(c24.93,-1.27) 25.33,-1.27 25.33,6.17 ; 28.65,9.67 34.85,9.67 ; 29.25,9.67 29.25,9.17 34.25,9.17 34.25,9.67 ; 29.25,11.57 29.25,16.77 34.25,16.77 34.25,11.57
3D body "AMPHENOL_L717DFC37P1ATN.stp": height 13.45, standoff -3.95, extent -34.85,-2.93 34.85,17.47

## AMPHENOL_L717DFE09P1ATN [mm] "Right Angled D-Sub 9 Male Contacts with Metal Bracket and Front Female Screwlock (UNC4-40)"
height 13.4
pads (11):
  round 1.6 hole 0.9: 1(5.48,-1.27) 2(2.74,-1.27) 3(0,-1.27) 4(-2.74,-1.27) 5(-5.48,-1.27) 6(4.11,1.27) 7(1.37,1.27) 8(-1.37,1.27) 9(-4.11,1.27)
  round 5.5 hole 3.2: 10(-12.495,0) 11(12.495,0)
Top Overlay:
  circle w0.2: c-12.5,5.2 r0.8
  circle w0.2: c12.5,5.2 r0.8
  lines w0.2: -15.35,10.67 -15.35,11.57 15.35,11.57 15.35,10.67 ; -15,9.67 -15,9.17 -10,9.17 -10,9.67 ; -15,11.57 -15,16.77 -10,16.77 -10,11.57 ; -14,-2.93 -15.6,-2.93 -15.6,10.67 15.6,10.67 15.6,-2.93 14,-2.93 ; -11,-2.93 -9.4,-2.93 -9.4,10.67 ; -9.539,9.67 -15.6,9.67 -9.4,9.67 ; -9.4,7.17 9.4,7.17 ; -8.142,11.57 -8.142,17.37 cw(c-7.842,17.37) -7.842,17.67 7.861,17.67 cw(c7.861,17.37) 8.161,17.37 8.161,11.57 ; -7.57,7.17 -7.57,6.17 7.57,6.17 7.57,7.17 ; 9.4,9.67 15.6,9.67 ; 9.4,10.67 9.4,-2.93 11,-2.93 ; 10,9.67 10,9.17 15,9.17 15,9.67 ; 10,11.57 10,16.77 15,16.77 15,11.57
  text "6" at 6.604,0.635 h1.5
  text "5" at -7.747,-2.032 h1.5
  text "1" at 6.731,-2.032 h1.5
  text "9" at -7.747,0.508 h1.5
Mechanical 8:
  lines w0.1: -13.5,0 -12.5,0 ; -12.5,-1 -12.5,0 ; -12.5,1 -12.5,0 ; -11.5,0 -12.5,0 ; -6.48,-1.27 -5.48,-1.27 ; -5.48,-2.27 -5.48,-1.27 ; -5.48,-0.27 -5.48,-1.27 ; -5.11,1.27 -4.11,1.27 ; -4.48,-1.27 -5.48,-1.27 ; -4.11,0.27 -4.11,1.27 ; -4.11,2.27 -4.11,1.27 ; -3.74,-1.27 -2.74,-1.27 ; -3.11,1.27 -4.11,1.27 ; -2.74,-2.27 -2.74,-1.27 ; -2.74,-0.27 -2.74,-1.27 ; -2.37,1.27 -1.37,1.27 ; -1.74,-1.27 -2.74,-1.27 ; -1.37,0.27 -1.37,1.27 ; -1.37,2.27 -1.37,1.27 ; -1,-1.27 0,-1.27 ; -1,0 0,0 ; -0.37,1.27 -1.37,1.27 ; 0,-2.27 0,-1.27 ; 0,-1 0,0 ; 0,-0.27 0,-1.27 ; 0,1 0,0 ; 0.37,1.27 1.37,1.27 ; 1,-1.27 0,-1.27 ; 1,0 0,0 ; 1.37,0.27 1.37,1.27 ; 1.37,2.27 1.37,1.27 ; 1.74,-1.27 2.74,-1.27 ; 2.37,1.27 1.37,1.27 ; 2.74,-2.27 2.74,-1.27 ; 2.74,-0.27 2.74,-1.27 ; 3.11,1.27 4.11,1.27 ; 3.74,-1.27 2.74,-1.27 ; 4.11,0.27 4.11,1.27 ; 4.11,2.27 4.11,1.27 ; 4.48,-1.27 5.48,-1.27 ; 5.11,1.27 4.11,1.27 ; 5.48,-2.27 5.48,-1.27 ; 5.48,-0.27 5.48,-1.27 ; 6.48,-1.27 5.48,-1.27 ; 11.5,0 12.5,0 ; 12.5,-1 12.5,0 ; 12.5,1 12.5,0 ; 13.5,0 12.5,0
Mechanical 14:
  circle w0.1: c-12.5,0 r1.6
  circle w0.1: c-12.5,5.2 r0.8
  circle w0.1: c12.5,5.2 r0.8
  circle w0.1: c12.5,0 r1.6
  lines w0.1: -15.35,10.67 -15.35,11.57 15.35,11.57 15.35,10.67 ; -15,9.67 -15,9.17 -10,9.17 -10,9.67 ; -15,11.57 -15,16.77 -10,16.77 -10,11.57 ; -9.539,9.67 -15.6,9.67 -9.4,9.67 ; -9.4,7.17 9.4,7.17 ; -9.4,10.67 -9.4,-2.93 -15.6,-2.93 -15.6,10.67 15.6,10.67 15.6,-2.93 9.4,-2.93 9.4,10.67 ; -8.142,11.57 -8.142,17.37 cw(c-7.842,17.37) -7.842,17.67 7.861,17.67 cw(c7.861,17.37) 8.161,17.37 8.161,11.57 ; -7.57,7.17 -7.57,6.17 7.57,6.17 7.57,7.17 ; -5.88,6.17 -5.88,-1.27 ccw(c-5.48,-1.27) -5.08,-1.27 -5.08,6.17 ; -4.51,6.17 -4.51,1.27 ccw(c-4.11,1.27) -3.71,1.27 -3.71,6.17 ; -3.14,6.17 -3.14,-1.27 ccw(c-2.74,-1.27) -2.34,-1.27 -2.34,6.17 ; -1.77,6.17 -1.77,1.27 ccw(c-1.37,1.27) -0.97,1.27 -0.97,6.17 ; -0.4,6.17 -0.4,-1.27 ccw(c0,-1.27) 0.4,-1.27 0.4,6.17 ; 0.97,6.17 0.97,1.27 ccw(c1.37,1.27) 1.77,1.27 1.77,6.17 ; 2.34,6.17 2.34,-1.27 ccw(c2.74,-1.27) 3.14,-1.27 3.14,6.17 ; 3.71,6.17 3.71,1.27 ccw(c4.11,1.27) 4.51,1.27 4.51,6.17 ; 5.08,6.17 5.08,-1.27 ccw(c5.48,-1.27) 5.88,-1.27 5.88,6.17 ; 9.4,9.67 15.6,9.67 ; 10,9.67 10,9.17 15,9.17 15,9.67 ; 10,11.57 10,16.77 15,16.77 15,11.57
3D body "AMPHENOL_L717DFE09P1ATN.stp": height 13.45, standoff -3.95, extent -15.6,-2.93 15.6,17.67